# Altium footprint library PCB封装库.PcbLib: 109 footprints (part 6 of 7)
Each footprint in its own frame and in the unit in brackets; x right, y up, seen from the top. Pads: shape width x height; smd on the part's side, far side on the other; paste and mask are expansions set on the pad; w line width, h text height; cw(c..) or ccw(c..) is an arc to the next point about the centre after c.
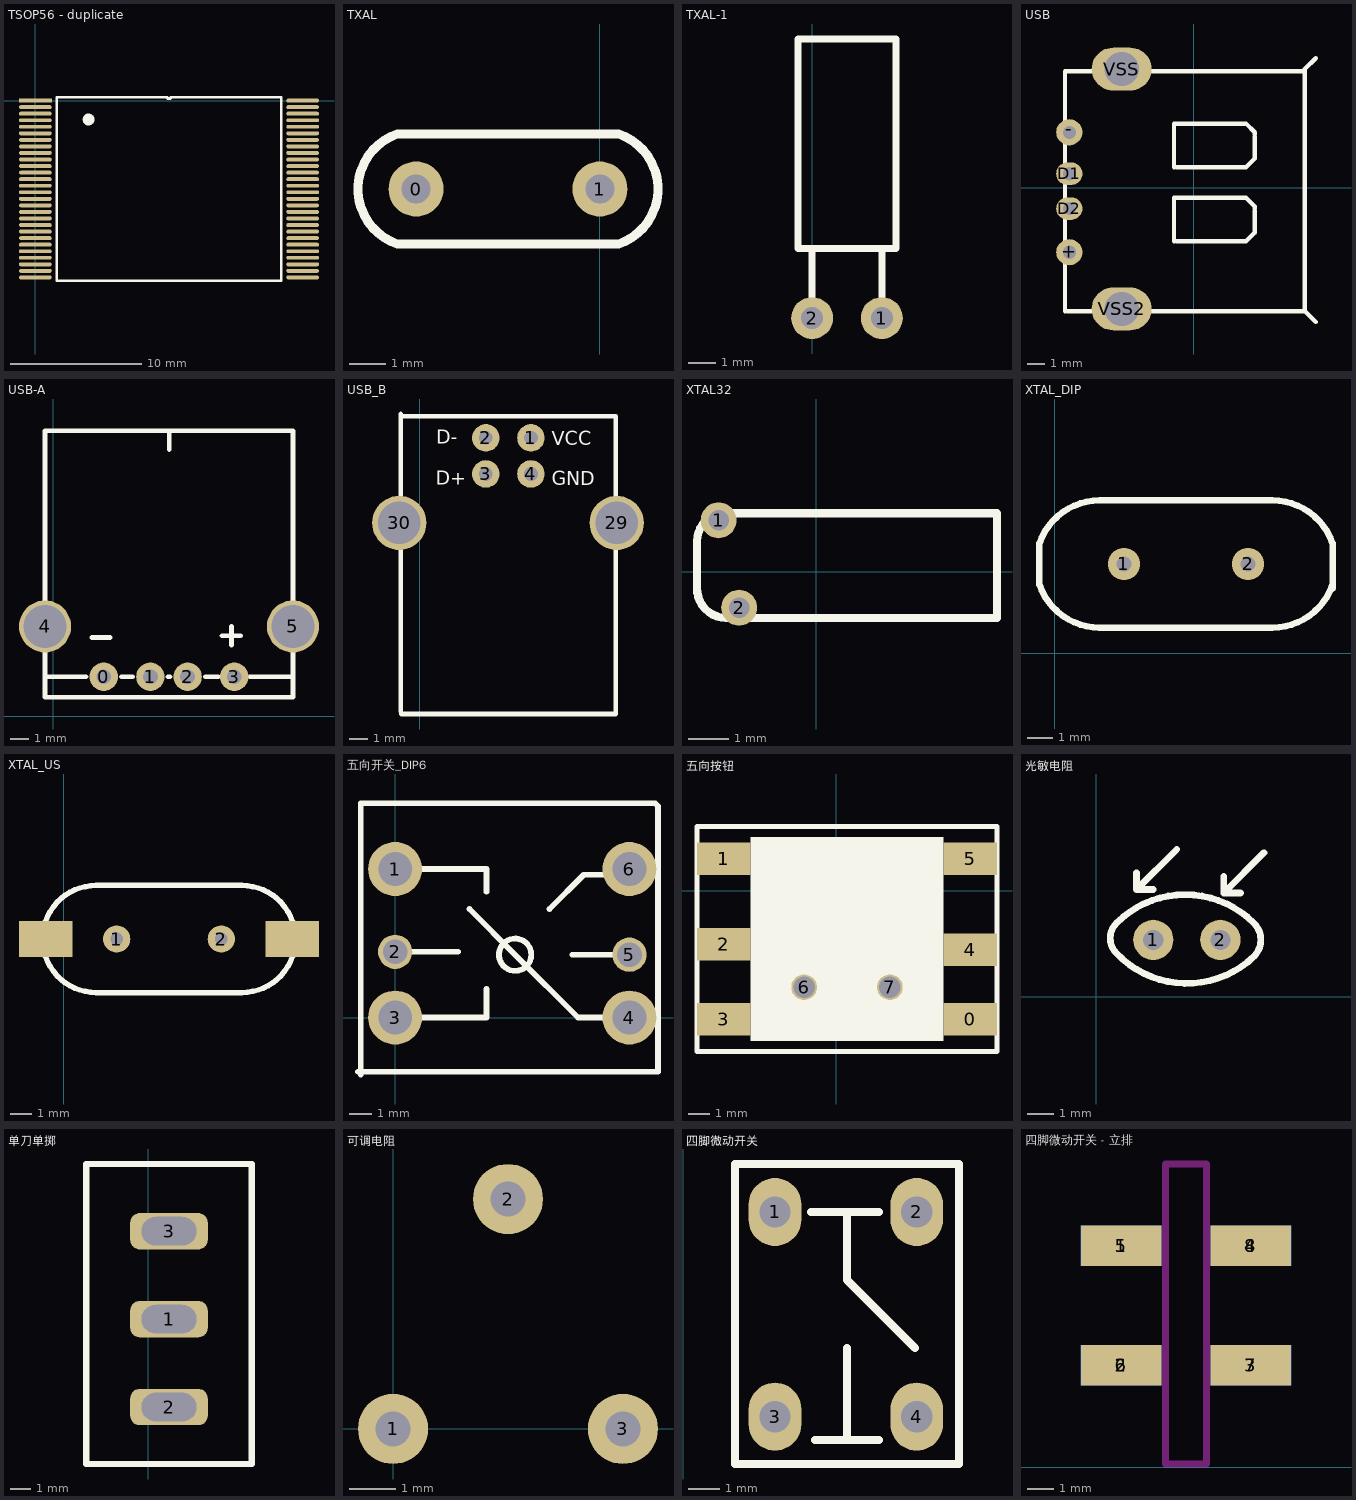
[diagram p5: the footprints below, top view; thin cyan lines are the x and y axes]

## TSOP56 - duplicate [mm]
pads (56):
  rect 2.5x0.3 smd: 1(0,0)
  oval 2.5x0.3 smd: 2(0,-0.5) 3(0,-1) 4(0,-1.5) 5(0,-2) 6(0,-2.5) 7(0,-3) 8(0,-3.5) 9(0,-4) 10(0,-4.5) 11(0,-5) 12(0,-5.5) 13(0,-6) 14(0,-6.5) 15(0,-7) 16(0,-7.5) 17(0,-8) 18(0,-8.5) 19(0,-9) 20(0,-9.5) 21(0,-10) 22(0,-10.5) 23(0,-11) 24(0,-11.5) 25(0,-12) 26(0,-12.5) 27(0,-13) 28(0,-13.5) 29(20.4,-13.5) 30(20.4,-13) 31(20.4,-12.5) 32(20.4,-12) 33(20.4,-11.5) 34(20.4,-11) 35(20.4,-10.5) 36(20.4,-10) 37(20.4,-9.5) 38(20.4,-9) 39(20.4,-8.5) 40(20.4,-8) 41(20.4,-7.5) 42(20.4,-7) 43(20.4,-6.5) 44(20.4,-6) 45(20.4,-5.5) 46(20.4,-5) 47(20.4,-4.5) 48(20.4,-4) 49(20.4,-3.5) 50(20.4,-3) 51(20.4,-2.5) 52(20.4,-2) 53(20.4,-1.5) 54(20.4,-1) 55(20.4,-0.5) 56(20.4,0)
Top Overlay:
  circle w0.254: c4.089,-1.448 r0.127
  circle w0.254: c4.064,-1.448 r0.33
  lines w0.2: 1.635,-13.75 1.635,0.25 10.075,0.25 ccw(c10.2,0.25) 10.325,0.25 18.765,0.25 18.765,-13.75 1.635,-13.75

## TXAL [mil]
pads (2):
  round 60 hole 31.5: 0(-200,200) 1(0,200)
Top Overlay:
  lines w10: -220,140 cw(c-200,200) -220,260 20,260 cw(c0,200) 20,140 -220,140

## TXAL-1 [mil]
pads (2):
  round 60 hole 31.5: 1(100,100) 2(0,100)
Top Overlay:
  lines w10: 0,100 0,200 ; 100,100 100,200 ; -20,200 -20,500 120,500 120,200 -20,200

## USB [mm]
pads (6):
  round 1.524 hole 0.762: +(-7.255,-3.757) -(-7.255,3.228)
  oval 1.524x1.324 hole 0.762: D1(-7.255,0.815) D2(-7.255,-1.217)
  oval 3.5x2.5 hole 2: VSS(-4.207,6.911) VSS2(-4.207,-7.059)
Top Overlay:
  lines w0.254: -7.509,-7.186 -7.509,6.784 6.461,6.784 ; -7.382,-7.186 6.461,-7.186 ; -1.159,-3.122 -1.159,-0.582 3.032,-0.582 3.54,-1.09 3.54,-1.217 ; -1.159,1.196 -1.159,3.736 3.032,3.736 3.54,3.228 3.54,3.101 ; -1.032,-3.122 3.032,-3.122 3.54,-2.614 3.54,-1.344 ; -1.032,1.196 3.032,1.196 3.54,1.704 3.54,2.974 ; 7.096,-7.821 6.461,-7.186 ; 7.096,7.546 6.461,6.911 6.461,6.784 ; 6.461,-7.186 6.461,6.784

## USB-A [mm]
pads (6):
  round 1.524 hole 0.8: 0(2.718,2.116) 1(5.218,2.116) 2(7.218,2.116) 3(9.718,2.116)
  round 2.8 hole 2.3: 4(-0.432,4.816) 5(12.868,4.816)
Top Overlay:
  lines w0.254: -0.432,2.116 1.768,2.116 ; 2.068,4.216 3.068,4.216 ; 3.668,2.116 4.268,2.116 ; 6.168,2.116 6.268,2.116 ; 6.228,14.316 6.228,15.316 ; 8.168,2.116 8.868,2.116 ; 9.068,4.316 10.068,4.316 ; 9.568,3.816 9.568,4.816 ; 10.568,2.116 12.868,2.116 ; -0.432,1.016 12.868,1.016 12.868,15.316 -0.432,15.316 -0.432,1.016
3D body: height 7.55, standoff -3.3, extent -1.677,1.016 14.123,15.176

## USB_B [mil]
pads (6):
  round 60 hole 30: 1(242,652) 2(143.57,652) 3(143.57,573.26) 4(242,573.26)
  round 118.11 hole 92.52: 29(429.01,466.57) 30(-45.01,466.57)
Top Overlay:
  lines w10: -42,55 -42,704 ; -41,50 427,50 427,699 -36,699
  text "VCC" at 287,636 h30
  text "D-" at 36,639 h30
  text "D+" at 35,550 h30
  text "GND" at 287,549 h30
3D body: height 433.07, standoff -143.42, extent -96.27,61.39 486.27,711

## XTAL32 [mil]
pads (2):
  round 35 hole 20: 1(-95,50) 2(-75,-35)
Top Overlay:
  lines w8: -116,-16 ccw(c-87.5,-16.5) -88,-45 176,-45 176,57 -88,57 ccw(c-88.5,29.5) -116,30 -116,-16
3D body: height 325.79, standoff -98.43, extent -82.99,-60 42.99,75.83

## XTAL_DIP [mil]
pads (2):
  round 50 hole 23: 1(107,138) 2(299.13,138)
Top Overlay:
  lines w10: 69,39.58 336.92,39.58 ccw(c336.92,138) 430.05,106.15 ; 69.2,39.58 cw(c69.2,138) -23.92,106.15 -23.92,169.85 cw(c69.2,138) 69.2,236.43 336.92,236.43 cw(c336.92,138) 430.05,169.85 430.05,100.05
3D body: height 137.8, standoff -157.48, extent -23.43,46.93 423.43,230

## XTAL_US [mil]
pads (4):
  round 50 hole 23: 1(97,-692) 2(289.13,-692)
  rect 98.43x66 smd: ""(-33.31,-692) ""(419.44,-692)
Top Overlay:
  lines w10: -33.92,-723.85 ccw(c59.2,-692) 59.2,-790.42 ; -33.92,-660.15 cw(c59.2,-692) 59.21,-593.58 326.92,-593.58 cw(c326.92,-692) 420.05,-660.15 ; 59,-790.42 326.92,-790.42 ccw(c326.92,-692) 420.05,-723.85
3D body: height 137.8, standoff -157.48, extent -33.43,-783.07 413.43,-600

## 五向开关_DIP6 [mm]
pads (6):
  round 2.4 hole 1.5: 1(0,6.604) 3(0,0) 4(10.414,0) 6(10.414,6.604)
  round 1.524 hole 1.1: 2(0,2.921) 5(10.414,2.794)
Top Overlay:
  circle w0.254: c5.334,2.794 r0.718
  lines w0.254: -1.651,-2.413 11.684,-2.413 11.684,9.398 11.557,9.525 -1.524,9.525 -1.524,-2.54 ; 0,0 4.064,0 4.064,1.27 ; 0,2.921 2.794,2.921 ; 0,6.604 4.064,6.604 4.064,5.588 ; 3.302,4.826 5.334,2.794 8.128,0 10.414,0 ; 6.858,4.826 8.382,6.35 10.16,6.35 ; 7.874,2.794 10.414,2.794
3D body: height 7.3, standoff -1.6, extent -0.59,-2.464 11.41,9.536

## 五向按钮 [mm]
pads (8):
  rect 2.5x1.524 smd: 0(6.25,-6) 1(-5.25,1.5) 2(-5.25,-2.5) 3(-5.25,-6) 4(6.25,-2.75) 5(6.25,1.5)
  round 1.2 hole 1: 6(-1.5,-4.5) 7(2.5,-4.5)
Top Overlay:
  rectangle: -4,-7 5,2.5
  lines w0.254: -6.5,-7.5 7.5,-7.5 7.5,3 -6.5,3 -6.5,-7.5
3D body: height 7.3, standoff -1.6, extent -5.416,-8.179 6.584,3.821

## 光敏电阻 [mil]
pads (2):
  round 60 hole 30: 1(85,85) 2(185,85)
Top Overlay:
  lines w10: 60,185 60,160 ; 120,220 60,160 ; 190,180 190,155 ; 250,215 190,155 ; 60,160 85,160 60,160 ; 190,155 215,155 190,155 ; 30,65 ccw(c135,165) 235,60 ccw(c210,85) 235,110 ccw(c132.5,7.5) 30,110 ccw(c52.5,87.5) 30,65
3D body: height 1283.15, standoff -206.85, extent 44,10 226,164

## 单刀单掷 [mil]
pads (3):
  rrect50% 150x70 hole 55.12 slot 106.3 at 0 deg: 1(40,330) 2(40,160) 3(40,500)
Top Overlay:
  lines w11.81: -120,50 -120,630 200,630 200,50 -120,50
3D body: height 216.54, standoff -531.89, extent -162,15.57 251.39,608.43

## 可调电阻 [mil]
pads (3):
  round 60 hole 30: 1(0,0) 2(98.43,196.85) 3(196.85,0)
3D body: height 165.35, standoff -220.47, extent -98.43,-98.43 295.28,303.15

## 四脚微动开关 [mil]
pads (4):
  oval 65.87x85 hole 39.37: 1(115,355) 2(292.17,355) 3(115,99.09) 4(292.17,99.09)
Top Overlay:
  lines w10: 160,355 245,355 ; 165,70 245,70 ; 205,75 205,185 ; 205,355 205,270 290,185 ; 65,40 65,415 345,415 345,40 65,40
3D body: height 275.59, standoff -137.8, extent 80.91,69.49 325,380.51

## 四脚微动开关 - 立排 [mm]
pads (8):
  rect 3x1.5 smd: 1(7.874,8.255) 2(7.874,3.81) 3(12.7,3.81) 4(12.7,8.255)
  rect 3x1.5 smd far side: 5(7.874,8.255) 6(7.874,3.81) 7(12.7,3.81) 8(12.7,8.255)
Keep-Out Layer:
  lines w0.254: 9.525,0.127 9.525,11.303 11.049,11.303 11.049,0.127 9.525,0.127